# Altium schematic symbol library IC_TI.SCHLIB: 1162 symbols (part 4 of 8) (continued)
## OPA333AIDBVR
designator U?
Integrated Circuit; Manufacturer_Name: Texas Instruments; Manufacturer_Part_Number: OPA333AIDBVR; Datasheet Link: http://www.ti.com/lit/gpn/opa333; Height: 1.45mm; Mouser Part Number: 595-OPA333AIDBVR; Mouser Price/Stock: https://www.mouser.com/Search/Refine.aspx?Keyword=595-OPA333AIDBVR
footprint SOT23-5 (SOT23, 5-Leads, Body 3.0x3.0mm (max), Pitch 0.95mm, IPC Medium Density)
pins: 1 OUT, 2 V-, 3 +IN, 4 -IN, 5 V+

## OPA333AIDG4
designator H??
Hardware; Manufacturer_Name: Texas Instruments; Manufacturer_Part_Number: OPA333AIDG4; Datasheet Link: http://www.ti.com/lit/ds/symlink/opa333.pdf; Height: 1.75mm; Mouser Part Number: 595-OPA333AIDG4; Mouser Price/Stock: https://www.mouser.com/Search/Refine.aspx?Keyword=595-OPA333AIDG4
footprint SOIC8_1.27 (SOP, 8-Leads, Pitch 1.27mm)
pins: 1 NC_1, 2 -IN, 3 +IN, 4 V-, 5 NC_2, 6 OUT, 7 V+, 8 NC_3

## OPA336NA
designator U?
Integrated Circuit; Manufacturer_Name: Texas Instruments; Manufacturer_Part_Number: OPA336NA
footprint SOT23-5 (SOT23, 5-Leads, Body 3.0x3.0mm (max), Pitch 0.95mm, IPC Medium Density)
pins: 1 OUT, 2 V-, 3 +IN, 4 -IN, 5 V+

## OPA340NA_250
designator U?
Integrated Circuit; Manufacturer_Name: Texas Instruments; Manufacturer_Part_Number: OPA340NA/250; Datasheet Link: http://docs-emea.rs-online.com/webdocs/0216/0900766b802160a6.pdf; Height: 1.45mm; Mouser Part Number: 595-OPA340NA/250; Mouser Price/Stock: https://www.mouser.com/Search/Refine.aspx?Keyword=595-OPA340NA%2F250; RS Part Number: 1455752; RS Price/Stock: http://uk.rs-online.com/web/p/products/1455752
footprint SOT23-5 (SOT23, 5-Leads, Body 3.0x3.0mm (max), Pitch 0.95mm, IPC Medium Density)
pins: 1 OUT (out), 2 V-, 3 IN+ (in), 4 IN- (in), 5 V+

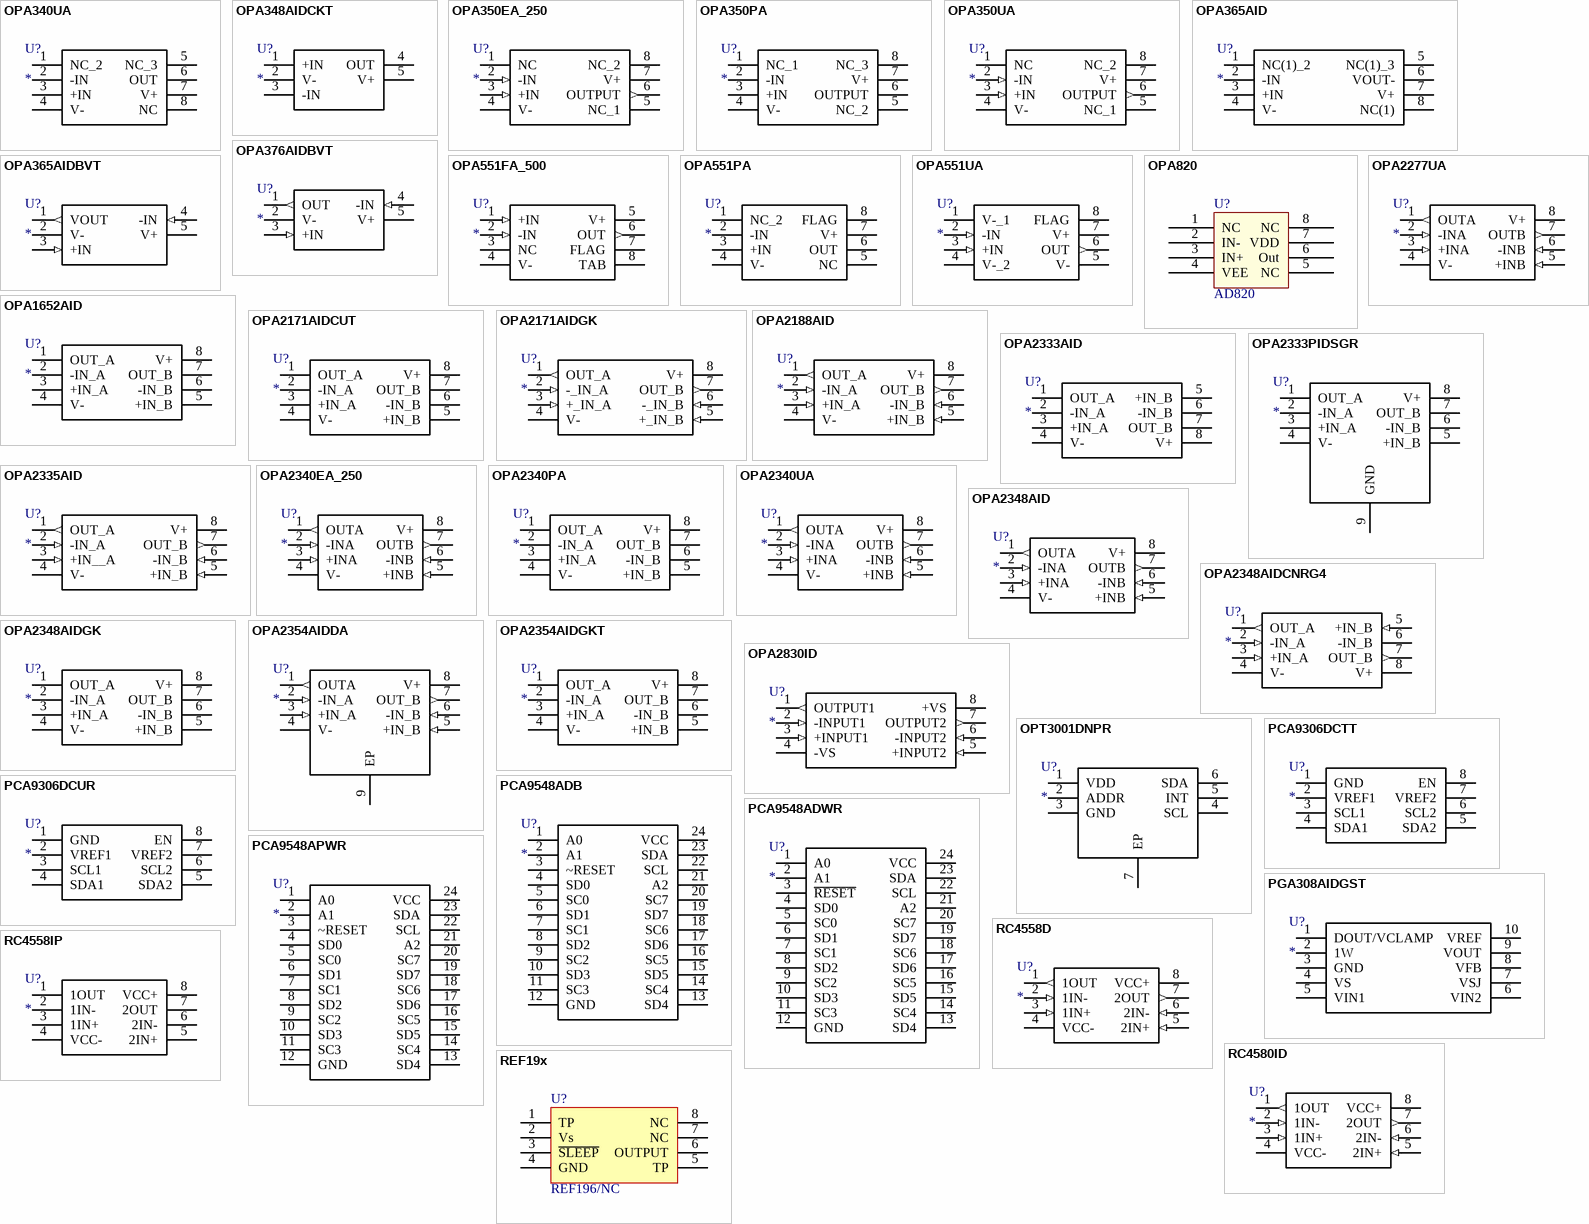
[diagram p16: symbols OPA340UA to REF19x]

## OPA340UA
designator U?
Integrated Circuit; Manufacturer_Name: Texas Instruments; Manufacturer_Part_Number: OPA340UA; Datasheet Link: http://componentsearchengine.com/Datasheets/3/OPA340UA.pdf; Mouser Part Number: 595-OPA340UA; Mouser Price/Stock: https://www.mouser.com/Search/Refine.aspx?Keyword=595-OPA340UA; RS Part Number: 1219113; RS Price/Stock: http://uk.rs-online.com/web/p/products/1219113
footprint SOIC8_1.27 (SOP, 8-Leads, Pitch 1.27mm)
pins: 1 NC_2, 2 -IN, 3 +IN, 4 V-, 5 NC_3, 6 OUT, 7 V+, 8 NC

## OPA348AIDCKT
designator U?
Integrated Circuit; Manufacturer_Name: Texas Instruments; Manufacturer_Part_Number: OPA348AIDCKT; Datasheet Link: http://uk.rs-online.com/web/p/products/6609820; Height: 1.1mm; Mouser Part Number: 595-OPA348AIDCKT; Mouser Price/Stock: https://www.mouser.com/Search/Refine.aspx?Keyword=595-OPA348AIDCKT; RS Part Number: 1788976; RS Price/Stock: http://uk.rs-online.com/web/p/products/1788976
footprint SOT353
pins: 1 +IN, 2 V-, 3 -IN, 4 OUT, 5 V+

## OPA350EA_250
designator U?
Integrated Circuit; Manufacturer_Name: Texas Instruments; Manufacturer_Part_Number: OPA350EA/250; Datasheet Link: http://www.ti.com/lit/ds/symlink/opa350.pdf; Height: 1.1mm; Mouser Part Number: 595-OPA350EA/250; Mouser Price/Stock: https://www.mouser.com/Search/Refine.aspx?Keyword=595-OPA350EA%2F250; RS Part Number: 4622339P; RS Price/Stock: http://uk.rs-online.com/web/p/products/4622339P
footprint VSSOP8_0.65-PAD
pins: 1 NC, 2 -IN (in), 3 +IN (in), 4 V-, 5 NC_1, 6 OUTPUT (out), 7 V+, 8 NC_2

## OPA350PA
designator U?
Integrated Circuit; Manufacturer_Name: Texas Instruments; Manufacturer_Part_Number: OPA350PA; Datasheet Link: http://www.ti.com/lit/gpn/opa350; Height: 5.08mm; Mouser Part Number: 595-OPA350PA; Mouser Price/Stock: https://www.mouser.com/Search/Refine.aspx?Keyword=595-OPA350PA; RS Part Number: 9233580; RS Price/Stock: http://uk.rs-online.com/web/p/products/9233580
footprint DIP8-A
pins: 1 NC_1, 2 -IN, 3 +IN, 4 V-, 5 NC_2, 6 OUTPUT, 7 V+, 8 NC_3

## OPA350UA
designator U?
Integrated Circuit; Manufacturer_Name: Texas Instruments; Manufacturer_Part_Number: OPA350UA; Datasheet Link: http://www.ti.com/lit/ds/symlink/opa350.pdf; Height: 1.75mm; Mouser Part Number: 595-OPA350UA; Mouser Price/Stock: https://www.mouser.com/Search/Refine.aspx?Keyword=595-OPA350UA; RS Part Number: 1218553; RS Price/Stock: http://uk.rs-online.com/web/p/products/1218553
footprint SOIC8_1.27 (SOP, 8-Leads, Pitch 1.27mm)
pins: 1 NC, 2 -IN (in), 3 +IN (in), 4 V-, 5 NC_1, 6 OUTPUT (out), 7 V+, 8 NC_2

## OPA365AID
designator U?
Integrated Circuit; Manufacturer_Name: Texas Instruments; Manufacturer_Part_Number: OPA365AID; Datasheet Link: http://www.ti.com/lit/gpn/opa365; Mouser Part Number: 595-OPA365AID; Mouser Price/Stock: https://www.mouser.com/Search/Refine.aspx?Keyword=595-OPA365AID; RS Part Number: 1450986; RS Price/Stock: http://uk.rs-online.com/web/p/products/1450986
footprint SOIC8_1.27 (SOP, 8-Leads, Pitch 1.27mm)
pins: 1 NC(1)_2, 2 -IN, 3 +IN, 4 V-, 5 NC(1)_3, 6 VOUT-, 7 V+, 8 NC(1)

## OPA365AIDBVT
designator U?
Integrated Circuit; Manufacturer_Name: Texas Instruments; Manufacturer_Part_Number: OPA365AIDBVT; Datasheet Link: http://docs-emea.rs-online.com/webdocs/13f6/0900766b813f61e9.pdf; Height: 1.45mm; Mouser Part Number: 595-OPA365AIDBVT; Mouser Price/Stock: https://www.mouser.com/Search/Refine.aspx?Keyword=595-OPA365AIDBVT; RS Part Number: 6609830P; RS Price/Stock: http://uk.rs-online.com/web/p/products/6609830P
footprint SOT23-5 (SOT23, 5-Leads, Body 3.0x3.0mm (max), Pitch 0.95mm, IPC Medium Density)
pins: 1 VOUT (out), 2 V-, 3 +IN (in), 4 -IN (in), 5 V+

## OPA376AIDBVT
designator U?
Integrated Circuit; Manufacturer_Name: Texas Instruments; Manufacturer_Part_Number: OPA376AIDBVT; Datasheet Link: http://www.ti.com/lit/gpn/opa376; Height: 1.45mm; Mouser Part Number: 595-OPA376AIDBVT; Mouser Price/Stock: https://www.mouser.com/Search/Refine.aspx?Keyword=595-OPA376AIDBVT; RS Part Number: 0459550P; RS Price/Stock: http://uk.rs-online.com/web/p/products/0459550P
footprint SOT23-5 (SOT23, 5-Leads, Body 3.0x3.0mm (max), Pitch 0.95mm, IPC Medium Density)
pins: 1 OUT (out), 2 V- (power), 3 +IN (in), 4 -IN (in), 5 V+ (power)

## OPA551FA_500
designator U?
Integrated Circuit; Manufacturer_Name: Texas Instruments; Manufacturer_Part_Number: OPA551FA/500; Datasheet Link: http://www.ti.com/lit/ds/symlink/opa551.pdf; Height: 4.65mm; Mouser Part Number: 595-OPA551FA/500; Mouser Price/Stock: https://www.mouser.com/Search/Refine.aspx?Keyword=595-OPA551FA%2F500; RS Part Number: 9233729; RS Price/Stock: http://uk.rs-online.com/web/p/products/9233729
footprint TO263-7A
pins: 1 +IN (in), 2 -IN (in), 3 NC, 4 V-, 5 V+, 6 OUT (out), 7 FLAG, 8 TAB

## OPA551PA
designator U?
Integrated Circuit; Manufacturer_Name: Texas Instruments; Manufacturer_Part_Number: OPA551PA; Datasheet Link: http://componentsearchengine.com/Datasheets/3/OPA551PA.pdf; Mouser Part Number: 595-OPA551PA; Mouser Price/Stock: https://www.mouser.com/Search/Refine.aspx?Keyword=595-OPA551PA; RS Part Number: 9233782; RS Price/Stock: http://uk.rs-online.com/web/p/products/9233782
footprint DIP8
pins: 1 NC_2, 2 -IN, 3 +IN, 4 V-, 5 NC, 6 OUT, 7 V+, 8 FLAG

## OPA551UA
designator U?
Integrated Circuit; Manufacturer_Name: Texas Instruments; Manufacturer_Part_Number: OPA551UA; Datasheet Link: http://www.ti.com/lit/ds/symlink/opa551.pdf; Height: 1.75mm; Mouser Part Number: 595-OPA551UA; Mouser Price/Stock: https://www.mouser.com/Search/Refine.aspx?Keyword=595-OPA551UA; RS Part Number: 6611016P; RS Price/Stock: http://uk.rs-online.com/web/p/products/6611016P
footprint SOIC8_1.27 (SOP, 8-Leads, Pitch 1.27mm)
pins: 1 V-_1, 2 -IN (in), 3 +IN (in), 4 V-_2, 5 V-, 6 OUT (out), 7 V+, 8 FLAG

## OPA820
designator U?, comment AD820
footprint SOIC8_1.27 (SOP, 8-Leads, Pitch 1.27mm)
pins: 1 NC, 2 IN-, 3 IN+, 4 VEE, 5 NC, 6 Out, 7 VDD, 8 NC

## OPA1652AID
designator U?
Integrated Circuit; Manufacturer_Name: Texas Instruments; Manufacturer_Part_Number: OPA1652AID; Datasheet Link: http://www.ti.com/lit/gpn/opa1652; Height: 1.75mm; Mouser Part Number: 595-OPA1652AID; Mouser Price/Stock: https://www.mouser.com/Search/Refine.aspx?Keyword=595-OPA1652AID; RS Part Number: 1219356; RS Price/Stock: http://uk.rs-online.com/web/p/products/1219356
footprint SOIC8_1.27 (SOP, 8-Leads, Pitch 1.27mm)
pins: 1 OUT_A, 2 -IN_A, 3 +IN_A, 4 V-, 5 +IN_B, 6 -IN_B, 7 OUT_B, 8 V+

## OPA2171AIDCUT
designator U?
Integrated Circuit; Manufacturer_Name: Texas Instruments; Manufacturer_Part_Number: OPA2171AIDCUT; Datasheet Link: http://docs-emea.rs-online.com/webdocs/12f9/0900766b812f92b4.pdf; Height: 0.9mm; Mouser Part Number: 595-OPA2171AIDCUT; Mouser Price/Stock: https://www.mouser.com/Search/Refine.aspx?Keyword=595-OPA2171AIDCUT; RS Part Number: 1627804; RS Price/Stock: http://uk.rs-online.com/web/p/products/1627804
footprint VSSOP8_0.5(3X2)
pins: 1 OUT_A, 2 -IN_A, 3 +IN_A, 4 V-, 5 +IN_B, 6 -IN_B, 7 OUT_B, 8 V+

## OPA2171AIDGK
designator U?
Integrated Circuit; Manufacturer_Name: Texas Instruments; Manufacturer_Part_Number: OPA2171AIDGK; Datasheet Link: http://www.ti.com/lit/ds/symlink/opa2171.pdf; Height: 1.1mm; Mouser Part Number: 595-OPA2171AIDGK; Mouser Price/Stock: https://www.mouser.com/Search/Refine.aspx?Keyword=595-OPA2171AIDGK; RS Part Number: 1451276; RS Price/Stock: http://uk.rs-online.com/web/p/products/1451276
footprint VSSOP8_0.65
pins: 1 OUT_A (out), 2 -_IN_A (in), 3 +_IN_A (in), 4 V- (power), 5 +_IN_B (in), 6 -_IN_B (in), 7 OUT_B (out), 8 V+ (power)

## OPA2188AID
designator U?
Integrated Circuit; Manufacturer_Name: Texas Instruments; Manufacturer_Part_Number: OPA2188AID; Datasheet Link: http://www.ti.com/lit/ds/symlink/opa2188.pdf; Height: 1.75mm; Mouser Part Number: 595-OPA2188AID; Mouser Price/Stock: https://www.mouser.com/Search/Refine.aspx?Keyword=595-OPA2188AID; RS Part Number: 9212845; RS Price/Stock: http://uk.rs-online.com/web/p/products/9212845
footprint SOIC8_1.27 (SOP, 8-Leads, Pitch 1.27mm)
pins: 1 OUT_A (out), 2 -IN_A (in), 3 +IN_A (in), 4 V- (power), 5 +IN_B (in), 6 -IN_B (in), 7 OUT_B (out), 8 V+ (power)

## OPA2277UA
designator U?
Integrated Circuit; Manufacturer_Name: Texas Instruments; Manufacturer_Part_Number: OPA2277UA; Datasheet Link: http://docs-emea.rs-online.com/webdocs/002b/0900766b8002bf04.pdf; Height: 1.75mm; Mouser Part Number: 595-OPA2277UA; Mouser Price/Stock: https://www.mouser.com/Search/Refine.aspx?Keyword=595-OPA2277UA; RS Part Number: 6610729; RS Price/Stock: http://uk.rs-online.com/web/p/products/6610729
footprint SOIC8_1.27 (SOP, 8-Leads, Pitch 1.27mm)
pins: 1 OUTA (out), 2 -INA (in), 3 +INA (in), 4 V-, 5 +INB (in), 6 -INB (in), 7 OUTB (out), 8 V+

## OPA2333AID
designator U?
Integrated Circuit; Manufacturer_Name: Texas Instruments; Manufacturer_Part_Number: OPA2333AID; Datasheet Link: http://componentsearchengine.com/Datasheets/3/OPA2333AID.pdf; Mouser Part Number: 595-OPA2333AID; Mouser Price/Stock: https://www.mouser.com/Search/Refine.aspx?Keyword=595-OPA2333AID; RS Part Number: 9223072; RS Price/Stock: http://uk.rs-online.com/web/p/products/9223072
footprint SOIC8_1.27 (SOP, 8-Leads, Pitch 1.27mm)
pins: 1 OUT_A, 2 -IN_A, 3 +IN_A, 4 V-, 5 +IN_B, 6 -IN_B, 7 OUT_B, 8 V+

## OPA2333PIDSGR
designator U?
Integrated Circuit; Manufacturer_Name: Texas Instruments; Manufacturer_Part_Number: OPA2333PIDSGR; Datasheet Link: http://www.ti.com/lit/gpn/opa2333p; Height: 0.8mm; Mouser Part Number: 595-OPA2333PIDSGR; Mouser Price/Stock: https://www.mouser.com/Search/Refine.aspx?Keyword=595-OPA2333PIDSGR
footprint DFN8_0.5-PAD(2X2) (DFN8_0.5-PAD(3X3))
pins: 1 OUT_A, 2 -IN_A, 3 +IN_A, 4 V-, 5 +IN_B, 6 -IN_B, 7 OUT_B, 8 V+, 9 GND

## OPA2335AID
designator U?
Integrated Circuit; Manufacturer_Name: Texas Instruments; Manufacturer_Part_Number: OPA2335AID; Datasheet Link: http://www.ti.com/lit/ds/symlink/opa2335.pdf; Height: 1.75mm; Mouser Part Number: 595-OPA2335AID; Mouser Price/Stock: https://www.mouser.com/Search/Refine.aspx?Keyword=595-OPA2335AID; RS Part Number: 4618481P; RS Price/Stock: http://uk.rs-online.com/web/p/products/4618481P
footprint SOIC8_1.27 (SOP, 8-Leads, Pitch 1.27mm)
pins: 1 OUT_A (out), 2 -IN_A (in), 3 +IN__A (in), 4 V-, 5 +IN_B (in), 6 -IN_B (in), 7 OUT_B (out), 8 V+

## OPA2340EA_250
designator U?
Integrated Circuit; Manufacturer_Name: Texas Instruments; Manufacturer_Part_Number: OPA2340EA/250; Datasheet Link: http://www.ti.com/lit/ds/symlink/opa2340.pdf; Height: 1.1mm; Mouser Part Number: 595-OPA2340EA/250; Mouser Price/Stock: https://www.mouser.com/Search/Refine.aspx?Keyword=595-OPA2340EA%2F250; RS Part Number: 1219014; RS Price/Stock: http://uk.rs-online.com/web/p/products/1219014
footprint VSSOP8_0.65-PAD
pins: 1 OUTA (out), 2 -INA (in), 3 +INA (in), 4 V-, 5 +INB (in), 6 -INB (in), 7 OUTB (out), 8 V+

## OPA2340PA
designator U?
Integrated Circuit; Manufacturer_Name: Texas Instruments; Manufacturer_Part_Number: OPA2340PA; Datasheet Link: http://www.ti.com/lit/gpn/opa2340; Mouser Part Number: 595-OPA2340PA; Mouser Price/Stock: https://www.mouser.com/Search/Refine.aspx?Keyword=595-OPA2340PA; RS Part Number: 6605522P; RS Price/Stock: http://uk.rs-online.com/web/p/products/6605522P
footprint DIP8
pins: 1 OUT_A, 2 -IN_A, 3 +IN_A, 4 V-, 5 +IN_B, 6 -IN_B, 7 OUT_B, 8 V+

## OPA2340UA
designator U?
Integrated Circuit; Manufacturer_Name: Texas Instruments; Manufacturer_Part_Number: OPA2340UA; Datasheet Link: http://www.ti.com/lit/ds/symlink/opa2340.pdf; Height: 1.75mm; Mouser Part Number: 595-OPA2340UA; Mouser Price/Stock: https://www.mouser.com/Search/Refine.aspx?Keyword=595-OPA2340UA; RS Part Number: 6610754; RS Price/Stock: http://uk.rs-online.com/web/p/products/6610754
footprint SOIC8_1.27 (SOP, 8-Leads, Pitch 1.27mm)
pins: 1 OUTA (out), 2 -INA (in), 3 +INA (in), 4 V-, 5 +INB (in), 6 -INB (in), 7 OUTB (out), 8 V+

## OPA2348AID
designator U?
Integrated Circuit; Manufacturer_Name: Texas Instruments; Manufacturer_Part_Number: OPA2348AID; Datasheet Link: http://www.ti.com/lit/ds/symlink/opa2348.pdf; Height: 1.75mm; Mouser Part Number: 595-OPA2348AID; Mouser Price/Stock: https://www.mouser.com/Search/Refine.aspx?Keyword=595-OPA2348AID; RS Part Number: 1456718; RS Price/Stock: http://uk.rs-online.com/web/p/products/1456718
footprint SOIC8_1.27 (SOP, 8-Leads, Pitch 1.27mm)
pins: 1 OUTA (out), 2 -INA (in), 3 +INA (in), 4 V-, 5 +INB (in), 6 -INB (in), 7 OUTB (out), 8 V+

## OPA2348AIDCNRG4
designator U?
Integrated Circuit; Manufacturer_Name: Texas Instruments; Manufacturer_Part_Number: OPA2348AIDCNRG4; Datasheet Link: http://www.ti.com/product/opa2348?HQS=TI-null-null-alldatasheets-df-pf-SEP-wwe&DCM=yes; Height: 1.45mm; Mouser Part Number: 595-OPA2348AIDCNRG4; Mouser Price/Stock: https://www.mouser.com/Search/Refine.aspx?Keyword=595-OPA2348AIDCNRG4
footprint SOT23-8 (TSOP, 8-Leads, Body 2.9x1.6mm (max), Pitch 0.65mm, IPC Medium Density)
pins: 1 OUT_A (out), 2 -IN_A (in), 3 +IN_A (in), 4 V- (power), 5 +IN_B (in), 6 -IN_B (power), 7 OUT_B (out), 8 V+ (power)

## OPA2348AIDGK
designator U?
Integrated Circuit; Manufacturer_Name: Texas Instruments; Manufacturer_Part_Number: OPA2348AIDGK; Datasheet Link: http://www.ti.com/lit/ds/symlink/opa2348.pdf; Height: 1.1mm; Mouser Part Number: 595-OPA2348AIDGK; Mouser Price/Stock: https://www.mouser.com/Search/Refine.aspx?Keyword=595-OPA2348AIDGK
footprint VSSOP8_0.65
pins: 1 OUT_A, 2 -IN_A, 3 +IN_A, 4 V-, 5 +IN_B, 6 -IN_B, 7 OUT_B, 8 V+

## OPA2354AIDDA
designator U?
Integrated Circuit; Manufacturer_Name: Texas Instruments; Manufacturer_Part_Number: OPA2354AIDDA; Datasheet Link: http://www.ti.com/lit/ds/symlink/opa2354.pdf; Height: 1.7mm; Mouser Part Number: 595-OPA2354AIDDA; Mouser Price/Stock: https://www.mouser.com/Search/Refine.aspx?Keyword=595-OPA2354AIDDA; RS Part Number: 1218552; RS Price/Stock: http://uk.rs-online.com/web/p/products/1218552
footprint SOIC8_1.27-PAD
pins: 1 OUTA (out), 2 -IN_A (in), 3 +IN_A (in), 4 V-, 5 +IN_B (in), 6 -IN_B (in), 7 OUT_B (out), 8 V+, 9 EP

## OPA2354AIDGKT
designator U?
Integrated Circuit; Manufacturer_Name: Texas Instruments; Manufacturer_Part_Number: OPA2354AIDGKT; Mouser Part Number: 595-OPA2354AIDGKT; Mouser Price/Stock: https://www.mouser.com/Search/Refine.aspx?Keyword=595-OPA2354AIDGKT; RS Part Number: 1625194; RS Price/Stock: http://uk.rs-online.com/web/p/products/1625194
footprint VSSOP8_0.65
pins: 1 OUT_A, 2 -IN_A, 3 +IN_A, 4 V-, 5 +IN_B, 6 -IN_B, 7 OUT_B, 8 V+

## OPA2830ID
designator U?
Integrated Circuit; Manufacturer_Name: Texas Instruments; Manufacturer_Part_Number: OPA2830ID; Datasheet Link: http://docs-emea.rs-online.com/webdocs/0c8d/0900766b80c8d0eb.pdf; Height: 1.75mm; Mouser Part Number: 595-OPA2830ID; Mouser Price/Stock: https://www.mouser.com/Search/Refine.aspx?Keyword=595-OPA2830ID; RS Part Number: 6610858P; RS Price/Stock: http://uk.rs-online.com/web/p/products/6610858P
footprint SOIC8_1.27 (SOP, 8-Leads, Pitch 1.27mm)
pins: 1 OUTPUT1 (out), 2 -INPUT1 (in), 3 +INPUT1 (in), 4 -VS, 5 +INPUT2 (in), 6 -INPUT2 (in), 7 OUTPUT2 (out), 8 +VS

## OPT3001DNPR
designator U?
Integrated Circuit; Manufacturer_Name: Texas Instruments; Manufacturer_Part_Number: OPT3001DNPR; Datasheet Link: http://www.ti.com/lit/gpn/opt3001; Height: 0.65mm; Mouser Part Number: 595-OPT3001DNPR; Mouser Price/Stock: https://www.mouser.com/Search/Refine.aspx?Keyword=595-OPT3001DNPR
footprint DFN6_0.65-PAD(2.2X2.5)
pins: 1 VDD, 2 ADDR, 3 GND, 4 SCL, 5 INT, 6 SDA, 7 EP

## PCA9306DCTT
designator U?
Integrated Circuit; Manufacturer_Name: Texas Instruments; Manufacturer_Part_Number: PCA9306DCTT; Datasheet Link: http://www.ti.com/lit/gpn/pca9306; Height: 1.3mm; Mouser Part Number: 595-PCA9306DCTT; Mouser Price/Stock: https://www.mouser.com/Search/Refine.aspx?Keyword=595-PCA9306DCTT; RS Part Number: 1695652; RS Price/Stock: http://uk.rs-online.com/web/p/products/1695652
footprint VSSOP8_0.65(4X3)
pins: 1 GND, 2 VREF1, 3 SCL1, 4 SDA1, 5 SDA2, 6 SCL2, 7 VREF2, 8 EN

## PCA9306DCUR
designator U?
Integrated Circuit; Manufacturer_Name: Texas Instruments; Manufacturer_Part_Number: PCA9306DCUR; Datasheet Link: http://www.ti.com/lit/gpn/pca9306; Height: 0.9mm; Mouser Part Number: 595-PCA9306DCUR; Mouser Price/Stock: https://www.mouser.com/Search/Refine.aspx?Keyword=595-PCA9306DCUR; RS Part Number: 9222802; RS Price/Stock: http://uk.rs-online.com/web/p/products/9222802
footprint VSSOP8_0.5(3X2)
pins: 1 GND, 2 VREF1, 3 SCL1, 4 SDA1, 5 SDA2, 6 SCL2, 7 VREF2, 8 EN

## PCA9548ADB
designator U?
Integrated Circuit; Manufacturer_Name: Texas Instruments; Manufacturer_Part_Number: PCA9548ADB; Mouser Part Number: 595-PCA9548ADB; Mouser Price/Stock: https://www.mouser.com/Search/Refine.aspx?Keyword=595-PCA9548ADB; RS Part Number: 8122672P; RS Price/Stock: http://uk.rs-online.com/web/p/products/8122672P
footprint TSSOP24W_0.65 (TSOP, 24-Leads, Body 7.80x4.40mm, Pitch 0.65mm, Thermal Pad 5.16x2.40mm, IPC Low Density)
pins: 1 A0, 2 A1, 3 ~RESET, 4 SD0, 5 SC0, 6 SD1, 7 SC1, 8 SD2, 9 SC2, 10 SD3, 11 SC3, 12 GND, 13 SD4, 14 SC4, 15 SD5, 16 SC5, 17 SD6, 18 SC6, 19 SD7, 20 SC7, 21 A2, 22 SCL, 23 SDA, 24 VCC

## PCA9548ADWR
designator U?
Integrated Circuit; Manufacturer_Name: Texas Instruments; Manufacturer_Part_Number: PCA9548ADWR; Datasheet Link: http://www.ti.com/lit/gpn/pca9548a; Height: 2.65mm; Mouser Part Number: 595-PCA9548ADWR; Mouser Price/Stock: https://www.mouser.com/Search/Refine.aspx?Keyword=595-PCA9548ADWR
footprint SOIC24W_1.27
pins: 1 A0, 2 A1, 3 ~{RESET}, 4 SD0, 5 SC0, 6 SD1, 7 SC1, 8 SD2, 9 SC2, 10 SD3, 11 SC3, 12 GND, 13 SD4, 14 SC4, 15 SD5, 16 SC5, 17 SD6, 18 SC6, 19 SD7, 20 SC7, 21 A2, 22 SCL, 23 SDA, 24 VCC

## PCA9548APWR
designator U?
Integrated Circuit; Manufacturer_Name: Texas Instruments; Manufacturer_Part_Number: PCA9548APWR; Mouser Part Number: 595-PCA9548APWR; Mouser Price/Stock: https://www.mouser.com/Search/Refine.aspx?Keyword=595-PCA9548APWR
footprint TSSOP24_0.65 (TSOP, 24-Leads, Body 7.80x4.40mm, Pitch 0.65mm, Thermal Pad 5.16x2.40mm, IPC Low Density)
pins: 1 A0, 2 A1, 3 ~RESET, 4 SD0, 5 SC0, 6 SD1, 7 SC1, 8 SD2, 9 SC2, 10 SD3, 11 SC3, 12 GND, 13 SD4, 14 SC4, 15 SD5, 16 SC5, 17 SD6, 18 SC6, 19 SD7, 20 SC7, 21 A2, 22 SCL, 23 SDA, 24 VCC

## PGA308AIDGST
designator U?
Integrated Circuit; Manufacturer_Name: Texas Instruments; Manufacturer_Part_Number: PGA308AIDGST; Datasheet Link: http://www.ti.com/lit/gpn/pga308; Mouser Part Number: 595-PGA308AIDGST; Mouser Price/Stock: https://www.mouser.com/Search/Refine.aspx?Keyword=595-PGA308AIDGST
footprint VSSOP10_0.5
pins: 1 DOUT/VCLAMP, 2 1W, 3 GND, 4 VS, 5 VIN1, 6 VIN2, 7 VSJ, 8 VFB, 9 VOUT, 10 VREF

## RC4558D
designator U?
Integrated Circuit; Manufacturer_Name: Texas Instruments; Manufacturer_Part_Number: RC4558D; Datasheet Link: http://www.ti.com/lit/ds/symlink/rc4558.pdf; Height: 1.75mm; Mouser Part Number: 595-RC4558D; Mouser Price/Stock: https://www.mouser.com/Search/Refine.aspx?Keyword=595-RC4558D; RS Part Number: 6611072P; RS Price/Stock: http://uk.rs-online.com/web/p/products/6611072P
footprint SOIC8_1.27 (SOP, 8-Leads, Pitch 1.27mm)
pins: 1 1OUT (out), 2 1IN- (in), 3 1IN+ (in), 4 VCC- (power), 5 2IN+ (in), 6 2IN- (in), 7 2OUT (out), 8 VCC+ (power)

## RC4558IP
designator U?
Integrated Circuit; Manufacturer_Name: Texas Instruments; Manufacturer_Part_Number: RC4558IP; Datasheet Link: http://www.ti.com/lit/gpn/rc4558; Height: 5.08mm; Mouser Part Number: 595-RC4558IP; Mouser Price/Stock: https://www.mouser.com/Search/Refine.aspx?Keyword=595-RC4558IP; RS Part Number: 8072523; RS Price/Stock: http://uk.rs-online.com/web/p/products/8072523
footprint DIP8-A
pins: 1 1OUT, 2 1IN-, 3 1IN+, 4 VCC-, 5 2IN+, 6 2IN-, 7 2OUT, 8 VCC+

## RC4580ID
designator U?
Integrated Circuit; Manufacturer_Name: Texas Instruments; Manufacturer_Part_Number: RC4580ID; Datasheet Link: http://www.ti.com/lit/ds/symlink/rc4580.pdf; Height: 1.75mm; Mouser Part Number: 595-RC4580ID; Mouser Price/Stock: https://www.mouser.com/Search/Refine.aspx?Keyword=595-RC4580ID; RS Part Number: 1627296; RS Price/Stock: http://uk.rs-online.com/web/p/products/1627296
footprint SOIC8_1.27 (SOP, 8-Leads, Pitch 1.27mm)
pins: 1 1OUT (out), 2 1IN- (in), 3 1IN+ (in), 4 VCC- (power), 5 2IN+ (in), 6 2IN- (in), 7 2OUT (out), 8 VCC+ (power)

## REF19x
designator U?, comment REF196/NC
footprint SOIC8_1.27 (SOP, 8-Leads, Pitch 1.27mm)
pins: 1 TP, 2 Vs, 3 ~{SLEEP}, 4 GND, 5 TP, 6 OUTPUT, 7 NC, 8 NC

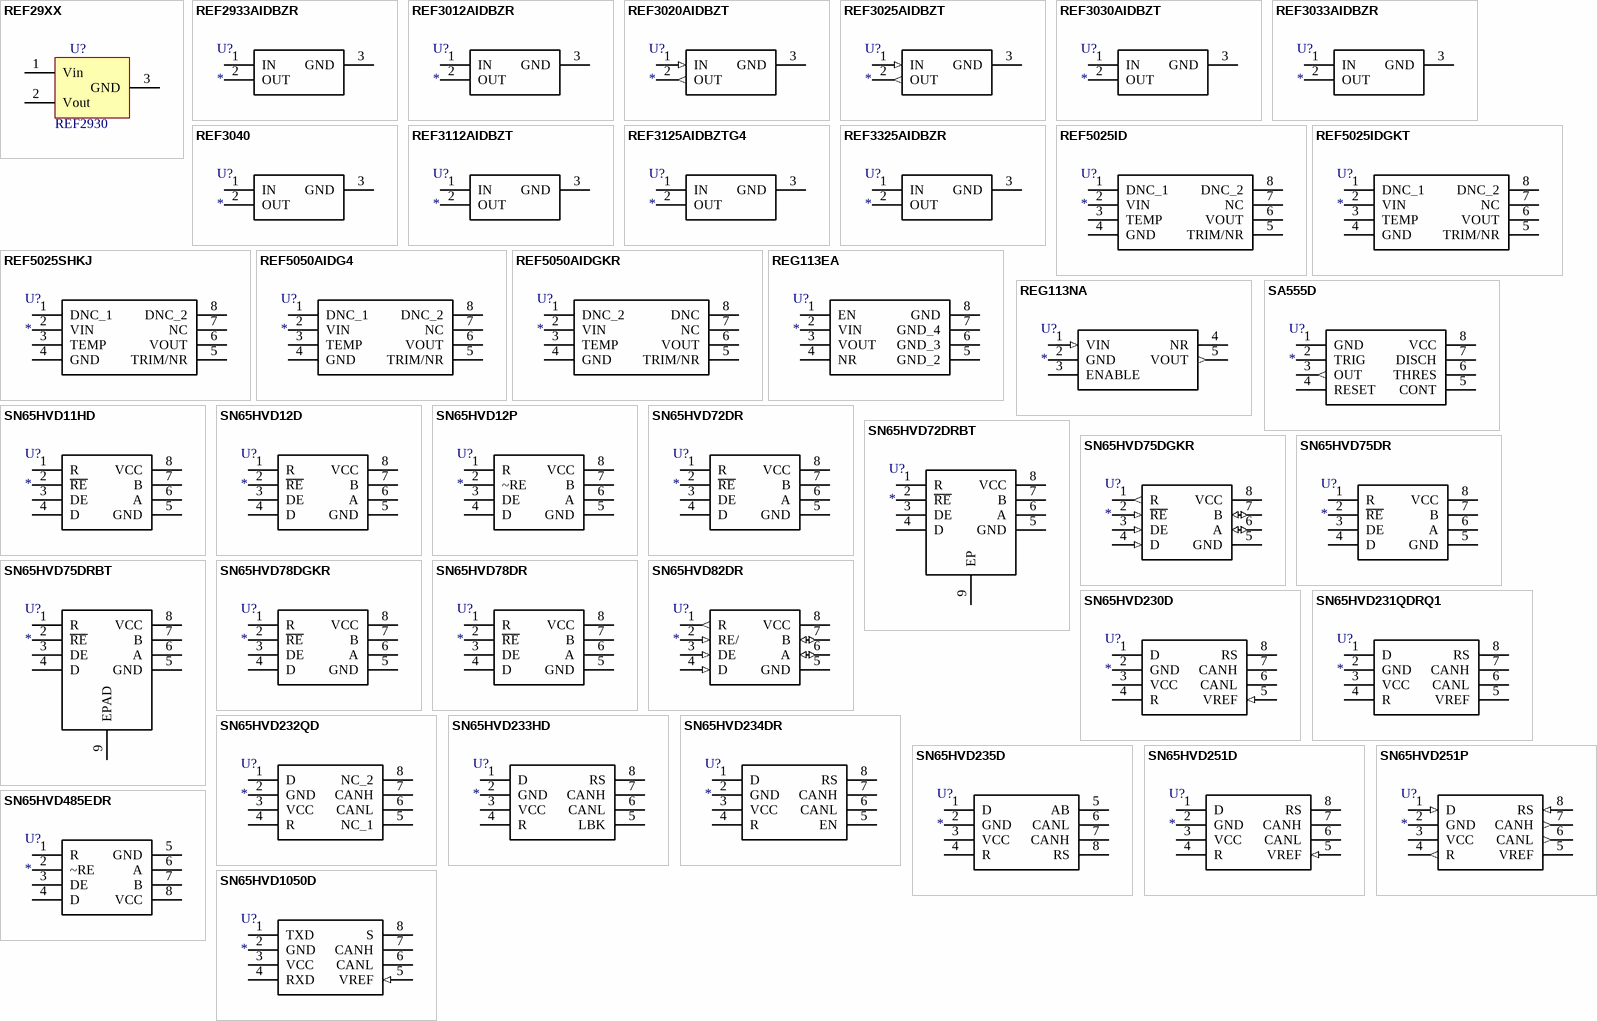
[diagram p17: symbols REF29XX to SN65HVD1050D]

## REF29XX
designator U?, comment REF2930
footprint SOT23-3
footprint SOT23-3
pins: 1 Vin, 2 Vout, 3 GND

## REF2933AIDBZR
designator U?
Integrated Circuit; Manufacturer_Name: Texas Instruments; Manufacturer_Part_Number: REF2933AIDBZR; Datasheet Link: http://www.ti.com/lit/ds/symlink/ref2912.pdf; Height: 1.12mm; Mouser Part Number: 595-REF2933AIDBZR; Mouser Price/Stock: https://www.mouser.com/Search/Refine.aspx?Keyword=595-REF2933AIDBZR
footprint SOT23-3 (贴片MOS的SOT-23封装)
pins: 1 IN, 2 OUT, 3 GND

## REF3012AIDBZR
designator U?
Integrated Circuit; Manufacturer_Name: Texas Instruments; Manufacturer_Part_Number: REF3012AIDBZR; Datasheet Link: http://www.ti.com/lit/gpn/ref3012; Height: 1.12mm; Mouser Part Number: 595-REF3012AIDBZR; Mouser Price/Stock: https://www.mouser.com/Search/Refine.aspx?Keyword=595-REF3012AIDBZR
footprint SOT23-3 (贴片MOS的SOT-23封装)
pins: 1 IN, 2 OUT, 3 GND

## REF3020AIDBZT
designator U?
Integrated Circuit; Manufacturer_Name: Texas Instruments; Manufacturer_Part_Number: REF3020AIDBZT; Datasheet Link: http://www.ti.com/lit/ds/symlink/ref3020.pdf; Height: 1.12mm; Mouser Part Number: 595-REF3020AIDBZT; Mouser Price/Stock: https://www.mouser.com/Search/Refine.aspx?Keyword=595-REF3020AIDBZT; RS Part Number: 4619535P; RS Price/Stock: http://uk.rs-online.com/web/p/products/4619535P
footprint SOT23-3 (贴片MOS的SOT-23封装)
pins: 1 IN (in), 2 OUT (out), 3 GND (power)

## REF3025AIDBZT
designator U?
Integrated Circuit; Manufacturer_Name: Texas Instruments; Manufacturer_Part_Number: REF3025AIDBZT; Datasheet Link: http://www.ti.com/lit/ds/symlink/ref3025.pdf; Height: 1.12mm; Mouser Part Number: 595-REF3025AIDBZT; Mouser Price/Stock: https://www.mouser.com/Search/Refine.aspx?Keyword=595-REF3025AIDBZT; RS Part Number: 1218560; RS Price/Stock: http://uk.rs-online.com/web/p/products/1218560
footprint SOT23-3 (贴片MOS的SOT-23封装)
pins: 1 IN (in), 2 OUT (out), 3 GND (power)

## REF3030AIDBZT
designator U?
Integrated Circuit; Manufacturer_Name: Texas Instruments; Manufacturer_Part_Number: REF3030AIDBZT; Datasheet Link: http://www.ti.com/lit/gpn/ref3030; Mouser Part Number: 595-REF3030AIDBZT; Mouser Price/Stock: https://www.mouser.com/Search/Refine.aspx?Keyword=595-REF3030AIDBZT; RS Part Number: 9222498; RS Price/Stock: http://uk.rs-online.com/web/p/products/9222498
footprint SOT23-3 (贴片MOS的SOT-23封装)
pins: 1 IN, 2 OUT, 3 GND
